# Altium footprint library main.PcbLib: 208 footprints (part 10 of 13)
Each footprint in its own frame and in the unit in brackets; x right, y up, seen from the top. Pads: shape width x height; smd on the part's side, far side on the other; paste and mask are expansions set on the pad; w line width, h text height; cw(c..) or ccw(c..) is an arc to the next point about the centre after c.
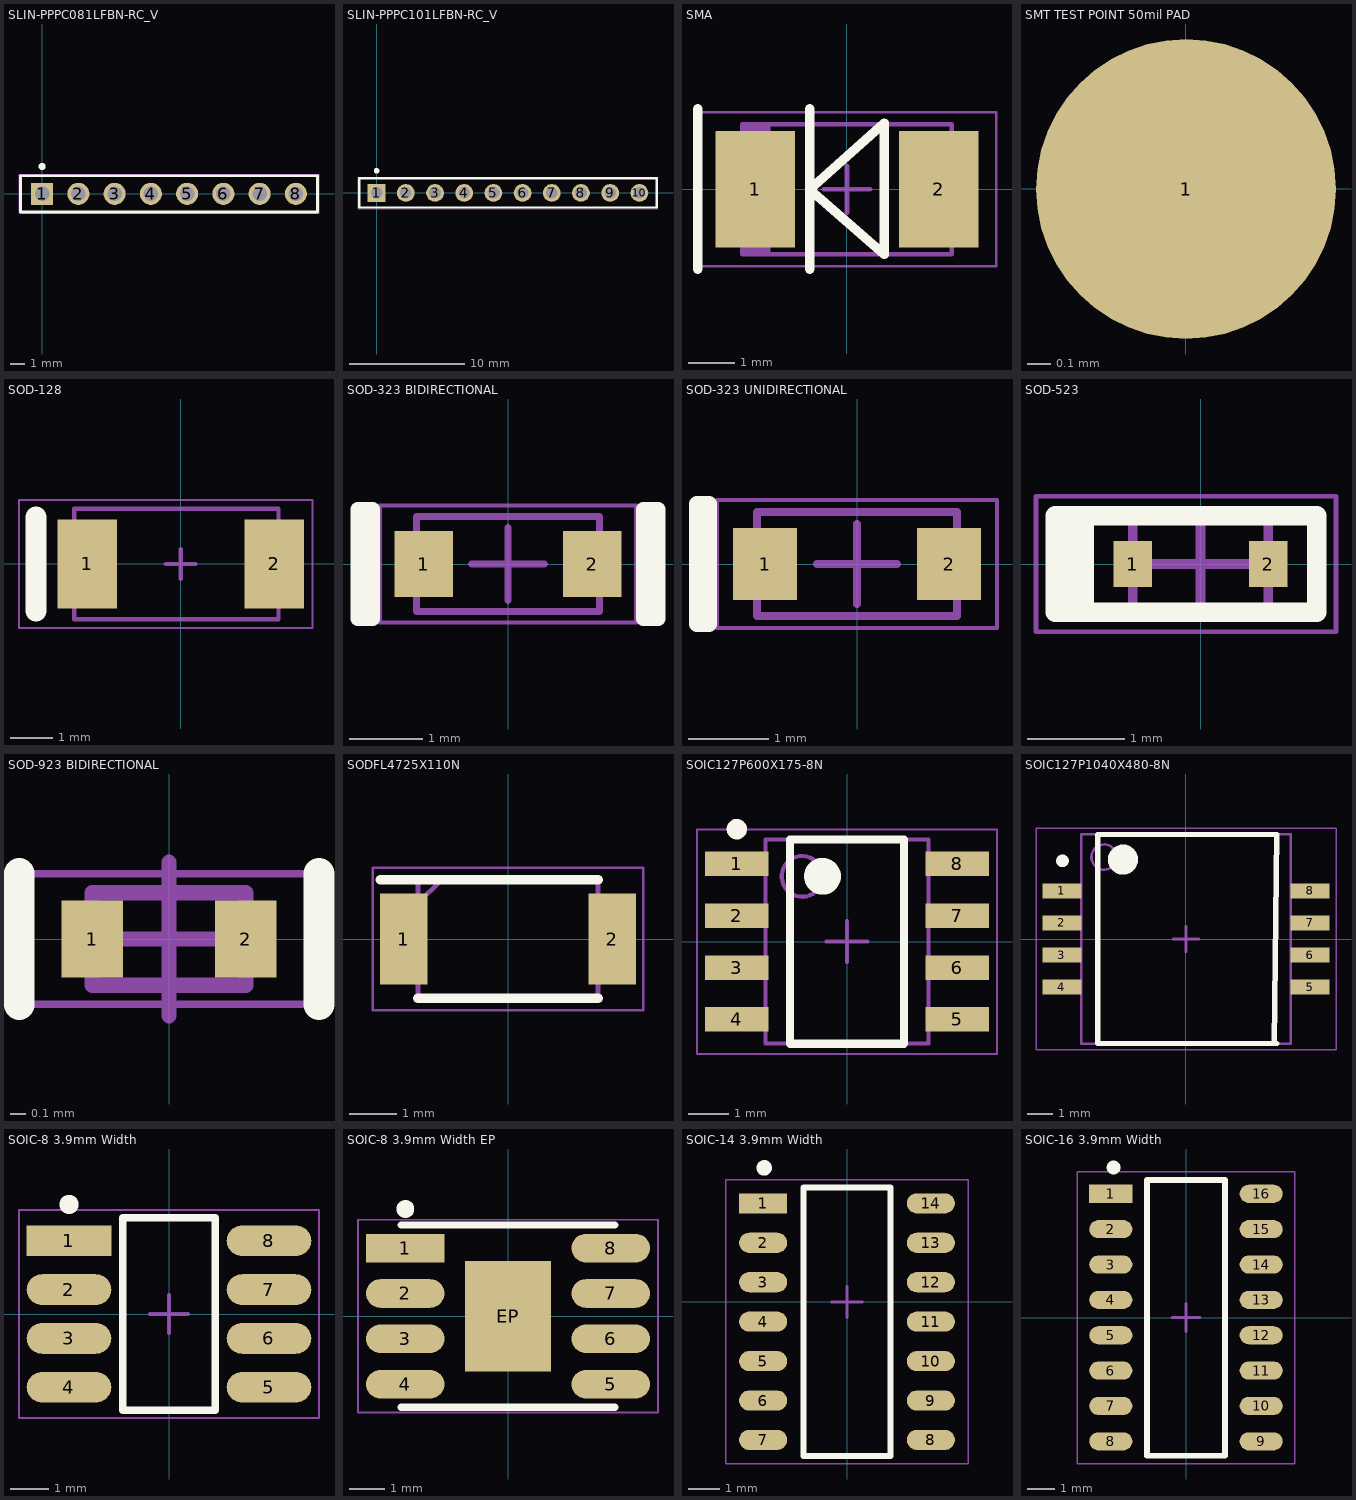
[diagram p9: the footprints below, top view; thin cyan lines are the x and y axes]

## SLIN-PPPC081LFBN-RC_V [mm] "THD, 8-Leads, Body 20.82x2.54mm, Pitch 2.54mm"
height 8.5
pads (8):
  rect 1.55x1.55 hole 1.02: 1(0,0)
  round 1.55 hole 1.02: 2(2.54,0) 3(5.08,0) 4(7.62,0) 5(10.16,0) 6(12.7,0) 7(15.24,0) 8(17.78,0)
Top Overlay:
  circle w0.25: c0,1.92 r0.125
  lines w0.2: -1.52,-1.27 19.3,-1.27 19.3,1.27 -1.52,1.27 -1.52,-1.27
Mechanical 7:
  text ".Designator" at 1.006,-0.677 h1.52
Mechanical 15:
  lines w0.05: -1.62,-1.37 19.4,-1.37 19.4,1.37 -1.62,1.37 -1.62,-1.37
3D body "_ _ _C081LFBN-RC.STEP": height 8.5, standoff -3.2, extent -1.52,-1.27 19.3,1.27

## SLIN-PPPC101LFBN-RC_V [mm] "THD, 10-Leads"
height 8.5
pads (10):
  rect 1.55x1.55 hole 1.02: 1(0,0)
  round 1.55 hole 1.02: 2(2.54,0) 3(5.08,0) 4(7.62,0) 5(10.16,0) 6(12.7,0) 7(15.24,0) 8(17.78,0) 9(20.32,0) 10(22.86,0)
Top Overlay:
  circle w0.25: c0,1.92 r0.125
  lines w0.2: -1.52,-1.27 24.38,-1.27 24.38,1.27 -1.52,1.27 -1.52,-1.27
Mechanical 7:
  text ".Designator" at 1.052,-0.686 h1.52
Mechanical 15:
  lines w0.05: -1.62,-1.37 24.48,-1.37 24.48,1.37 -1.62,1.37 -1.62,-1.37
3D body "User Library-zl262-10s_p2-54_l25-9_w2-54_h8-5.STEP": height 8.5, standoff -3, extent -1.52,-1.27 24.38,1.27

## SMA [mm] "SMA"
height 2.29
pads (2):
  rect 1.7x2.5 smd: 1(-1.967,0) 2(1.967,0)
Top Overlay:
  lines w0.2: -3.2,-1.714 -3.2,1.728 ; -0.8,-1.714 -0.8,1.728 ; -0.8,0 0.8,1.422 0.8,-1.397 -0.8,0
Mechanical 7:
  text ".Designator" at -1.651,-0.508 h1.52
Mechanical 13:
  rectangle: -2.25,-1.395 -1.645,1.395
  lines w0.1: -2.25,-1.395 2.25,-1.395 2.25,1.395 -2.25,1.395 -2.25,-1.395
Mechanical 15:
  lines w0.05: -3.2,-1.65 3.2,-1.65 3.2,1.65 -3.2,1.65 -3.2,-1.65
  lines w0.1: -0.5,0 0.5,0 ; 0,-0.5 0,0.5
3D body "DIOM4227X23N.step": height 2.29, standoff 0, extent -2.47,-1.395 2.47,1.395

## SMT TEST POINT 50mil PAD [mm] "SMT TEST POINT 50mil PAD"
height 1.8
pads (1):
  round 1.27 smd paste-2: 1(0,0)
Mechanical 7:
  text ".Designator" at -0.563,-0.327 h0.76
3D body: height 0.13, standoff 0, extent -0.639,-0.635 0.631,0.635

## SOD-128 [mm] "SOD-128"
height 0.4
pads (2):
  rect 1.4x2.1 smd: 1(-2.2,0) 2(2.2,0)
Top Overlay:
  lines w0.5: -3.4,-1.1 -3.4,1.1
Mechanical 7:
  text ".Designator" at -1,-0.4 h0.76
Mechanical 13:
  lines w0.1: -2.5,-1.3 2.3,-1.3 2.3,1.3 -2.5,1.3 -2.5,-1.3
Mechanical 15:
  lines w0.05: -3.8,-1.5 3.1,-1.5 3.1,1.5 -3.8,1.5 -3.8,-1.5
  lines w0.1: -0.35,0 0.35,0 ; 0,-0.35 0,0.35
3D body "SOD128.step": height 1.08, standoff 0.01, extent -2.45,-1.3 2.25,1.3

## SOD-323 BIDIRECTIONAL [mm] "SOD-323 BIDIRECTIONAL"
height 0.65
pads (2):
  rect 0.8x0.9 smd: 1(-1.15,0) 2(1.15,0)
Top Overlay:
  lines w0.2: -2.05,-0.75 -1.85,-0.75 ; -2.05,-0.732 -2.05,0.75 -1.85,0.75 -1.85,-0.732 ; 1.85,-0.75 2.05,-0.75 2.05,0.75 1.85,0.75 1.85,-0.75
Mechanical 7:
  text ".Designator" at -1.325,-0.454 h0.76
Mechanical 13:
  lines w0.1: -1.25,-0.65 1.25,-0.65 1.25,0.65 -1.25,0.65 -1.25,-0.65
Mechanical 15:
  lines w0.05: -1.75,-0.8 1.75,-0.8 1.75,0.8 -1.75,0.8 -1.75,-0.8
  lines w0.1: -0.5,0 0.5,0 ; 0,-0.5 0,0.5
3D body "User Library-SOD323.STEP": height 0.9, standoff -0.09, extent -1.25,-0.625 1.25,0.625

## SOD-323 UNIDIRECTIONAL [mm] "SOD-323 UNIDIRECTIONAL"
height 0.65
pads (2):
  rect 0.8x0.9 smd: 1(-1.15,0) 2(1.15,0)
Top Overlay:
  lines w0.2: -2,-0.75 -1.85,-0.75 -1.85,0.75 -2,0.75 -2,-0.75
Mechanical 7:
  text ".Designator" at -1.325,-0.454 h0.76
Mechanical 13:
  lines w0.1: -1.25,-0.65 1.25,-0.65 1.25,0.65 -1.25,0.65 -1.25,-0.65
Mechanical 15:
  lines w0.05: -1.75,-0.8 1.75,-0.8 1.75,0.8 -1.75,0.8 -1.75,-0.8
  lines w0.1: -0.5,0 0.5,0 ; 0,-0.5 0,0.5
3D body "User Library-SOD323.STEP": height 0.9, standoff -0.09, extent -1.25,-0.625 1.25,0.625

## SOD-523 [mm] "SOD-523"
height 1.35
pads (2):
  rect 0.4x0.48 smd: 1(-0.7,0) 2(0.7,0)
Top Overlay:
  lines w0.2: -1.4,-0.5 -1.4,0.5 -1.3,0.4 -1.3,-0.5 -1.2,-0.5 ; -1.2,0.5 -1.2,-0.5 ; -1.1,-0.5 -1.5,-0.5 -1.5,0.5 1.2,0.5 1.2,-0.5 -1.2,-0.5
Mechanical 7:
  text ".Designator" at -1,-0.4 h0.76
Mechanical 13:
  lines w0.1: -0.7,-0.5 -0.7,0.5 0.7,0.5 0.7,-0.5 -0.7,-0.5
Mechanical 15:
  lines w0.05: -1.7,-0.7 -1.7,0.7 1.4,0.7 1.4,-0.7 -1.7,-0.7
  lines w0.1: -0.5,0 0.5,0 -0.5,0 ; 0,-0.5 0,0.5 0,-0.5
3D body "User Library-SOD-523F.step": height 0.7, standoff 0, extent -0.8,-0.399 0.8,0.399

## SOD-923 BIDIRECTIONAL [mm] "SOD-923 BIDIRECTIONAL"
height 0.65
pads (2):
  rect 0.4x0.5 smd: 1(-0.5,0) 2(0.5,0)
Top Overlay:
  lines w0.2: -0.975,-0.425 -0.975,0.425 -0.975,-0.425 ; 0.975,-0.425 0.975,0.425 0.975,-0.425
Mechanical 7:
  text ".Designator" at -1.325,-0.454 h0.76
Mechanical 13:
  lines w0.1: -0.5,-0.3 -0.5,0.3 0.5,0.3 0.5,-0.3 -0.5,-0.3
Mechanical 15:
  lines w0.05: -0.975,-0.425 -0.975,0.425 0.975,0.425 0.975,-0.425 -0.975,-0.425
  lines w0.1: -0.5,0 0.5,0 ; 0,-0.5 0,0.5
3D body "SOD-923.STEP": height 0.4, standoff 0, extent -0.5,-0.3 0.5,0.3

## SODFL4725X110N [mm]
pads (2):
  rect 1x1.93 smd: 1(-2.2,0) 2(2.2,0)
Top Overlay:
  lines w0.2: -2.7,1.25 1.9,1.25 ; -1.9,-1.25 1.9,-1.25
Mechanical 13:
  lines w0.1: -1.9,0.75 -1.4,1.25 ; -1.9,-1.25 -1.9,1.25 1.9,1.25 1.9,-1.25 -1.9,-1.25
Mechanical 15:
  lines w0.05: -2.85,-1.5 -2.85,1.5 2.85,1.5 2.85,-1.5 -2.85,-1.5
3D body "PMEG60T50ELPX.stp": height 1.1, standoff 0, extent -2.35,-1.25 2.35,1.25

## SOIC127P600X175-8N [mm] "SOIC, 8-Leads, Body 4.90x3.90mm, Pitch 1.27mm, IPC Medium Density"
height 1.75
pads (8):
  rect 1.55x0.6 smd: 1(-2.7,1.905) 2(-2.7,0.635) 3(-2.7,-0.635) 4(-2.7,-1.905) 5(2.7,-1.905) 6(2.7,-0.635) 7(2.7,0.635) 8(2.7,1.905)
Top Overlay:
  circle w0.6: c-0.6,1.6 r0.15
  circle w0.25: c-2.7,2.755 r0.125
  lines w0.2: -1.4,-2.5 1.4,-2.5 1.4,2.5 -1.4,2.5 -1.4,-2.5
Mechanical 7:
  text ".Designator" at -2.921,-0.762 h1.52
Mechanical 13:
  circle w0.1: c-1.1,1.6 r0.5
  lines w0.1: -2,-2.5 2,-2.5 2,2.5 -2,2.5 -2,-2.5
Mechanical 15:
  lines w0.05: -3.675,-2.75 3.675,-2.75 3.675,2.75 -3.675,2.75 -3.675,-2.75
  lines w0.1: -0.5,0 0.5,0 ; 0,-0.5 0,0.5
3D body: height 1.75, standoff 0.2, extent -2,-2.5 2,2.5

## SOIC127P1040X480-8N [mm] "SOIC, 8-Leads, Body 8.26x8.26mm, Pitch 1.27mm, IPC Medium Density"
height 4.8
pads (8):
  rect 1.55x0.6 smd: 1(-4.925,1.905) 2(-4.925,0.635) 3(-4.925,-0.635) 4(-4.925,-1.905) 5(4.925,-1.905) 6(4.925,-0.635) 7(4.925,0.635) 8(4.925,1.905)
Top Overlay:
  circle w0.25: c-4.9,3.1 r0.125
  circle w0.6: c-2.5,3.15 r0.3
  lines w0.2: 3.5,-4.15 3.6,4.15 -3.5,4.15 -3.5,-4.15 3.6,-4.15
Mechanical 7:
  text ".Designator" at -3.615,-0.902 h1.52
Mechanical 13:
  circle w0.1: c-3.25,3.25 r0.5
  lines w0.1: -4.15,-4.15 -4.15,4.15 4.15,4.15 4.15,-4.15 -4.15,-4.15
Mechanical 15:
  lines w0.05: -5.95,-4.4 -5.95,4.4 5.95,4.4 5.95,-4.4 -5.95,-4.4
  lines w0.1: -0.5,0 0.5,0 ; 0,-0.5 0,0.5
3D body: height 9.88, standoff 4.8, extent -1.65,-1.647 1.65,1.647
3D body: height 4.8, standoff 0.36, extent -4.15,-4.15 4.15,4.15

## SOIC-8 3.9mm Width [mm] "SOIC-8 3.9mm Width"
height 2.65
pads (8):
  rect 2.2x0.8 smd mask+0.05: 1(-2.6,1.905)
  oval 2.2x0.8 smd mask+0.05: 2(-2.6,0.635) 3(-2.6,-0.635) 4(-2.6,-1.905) 5(2.6,-1.905) 6(2.6,-0.635) 7(2.6,0.635) 8(2.6,1.905)
Top Overlay:
  circle w0.25: c-2.6,2.85 r0.125
  lines w0.2: -1.2,-2.5 -1.2,2.5 1.2,2.5 1.2,-2.5 -1.2,-2.5
Mechanical 15:
  lines w0.05: -3.9,-2.7 -3.9,2.7 3.9,2.7 3.9,-2.7 -3.9,-2.7
  lines w0.1: -0.5,0 0.5,0 ; 0,-0.5 0,0.5
3D body "User Library-SOIC-8-1.STEP": height 1.75, standoff 0, extent -3,-2.45 3,2.45

## SOIC-8 3.9mm Width EP [mm] "SOIC-8 3.9mm Width EP"
height 2.65
pads (9):
  rect 2.2x0.8 smd mask+0.05: 1(-2.875,1.905)
  oval 2.2x0.8 smd mask+0.05: 2(-2.875,0.635) 3(-2.875,-0.635) 4(-2.875,-1.905) 5(2.875,-1.905) 6(2.875,-0.635) 7(2.875,0.635) 8(2.875,1.905)
  rect 2.4x3.1 all layers, no hole: EP(0,0)
Top Overlay:
  circle w0.25: c-2.875,3 r0.125
  lines w0.2: -3,-2.55 3,-2.55 ; -3,2.55 3,2.55
Mechanical 15:
  lines w0.05: -4.2,-2.7 -4.2,2.7 4.2,2.7 4.2,-2.7 -4.2,-2.7
3D body "User Library-SOIC-8-1.STEP": height 1.75, standoff 0, extent -3,-2.45 3,2.45

## SOIC-14 3.9mm Width [mm] "SOIC-14 3.9mm Width"
height 2.65
pads (14):
  rect 1.55x0.65 smd mask+0.05: 1(-2.7,3.175)
  oval 1.55x0.65 smd mask+0.05: 2(-2.7,1.905) 3(-2.7,0.635) 4(-2.7,-0.635) 5(-2.7,-1.905) 6(-2.7,-3.175) 7(-2.7,-4.445) 8(2.7,-4.445) 9(2.7,-3.175) 10(2.7,-1.905) 11(2.7,-0.635) 12(2.7,0.635) 13(2.7,1.905) 14(2.7,3.175)
Top Overlay:
  circle w0.25: c-2.667,4.318 r0.125
  lines w0.2: -1.4,-4.96 -1.4,3.683 1.4,3.683 1.4,-4.96 -1.4,-4.96
Mechanical 15:
  lines w0.05: -3.9,-5.207 -3.9,3.937 3.9,3.937 3.9,-5.207 -3.9,-5.207
  lines w0.1: -0.5,0 0.5,0 ; 0,-0.5 0,0.5
3D body "User Library-SOIC14-150-1.STEP": height 1.75, standoff 0, extent -2.9,-4.9 2.9,3.63

## SOIC-16 3.9mm Width [mm] "SOIC-16 3.9mm Width"
height 2.65
pads (16):
  rect 1.55x0.65 smd mask+0.05: 1(-2.7,4.445)
  oval 1.55x0.65 smd mask+0.05: 2(-2.7,3.175) 3(-2.7,1.905) 4(-2.7,0.635) 5(-2.7,-0.635) 6(-2.7,-1.905) 7(-2.7,-3.175) 8(-2.7,-4.445) 9(2.7,-4.445) 10(2.7,-3.175) 11(2.7,-1.905) 12(2.7,-0.635) 13(2.7,0.635) 14(2.7,1.905) 15(2.7,3.175) 16(2.7,4.445)
Top Overlay:
  circle w0.25: c-2.6,5.39 r0.125
  lines w0.2: -1.4,-4.96 1.4,-4.96 1.4,4.94 -1.4,4.94 -1.4,-4.96
Mechanical 15:
  lines w0.05: -3.9,-5.26 3.9,-5.26 3.9,5.24 -3.9,5.24 -3.9,-5.26
  lines w0.1: -0.5,0 0.5,0 ; 0,-0.5 0,0.5
3D body "User Library-SOIC-16-1.STEP": height 1.4, standoff 0, extent -3,-4.95 3,4.95